# Altium footprint library LUMI_Standard_Auto_Soldering_LIB.PcbLib: 344 footprints (part 1 of 22)
Each footprint in its own frame and in the unit in brackets; x right, y up, seen from the top. Pads: shape width x height; smd on the part's side, far side on the other; paste and mask are expansions set on the pad; w line width, h text height; cw(c..) or ccw(c..) is an arc to the next point about the centre after c.
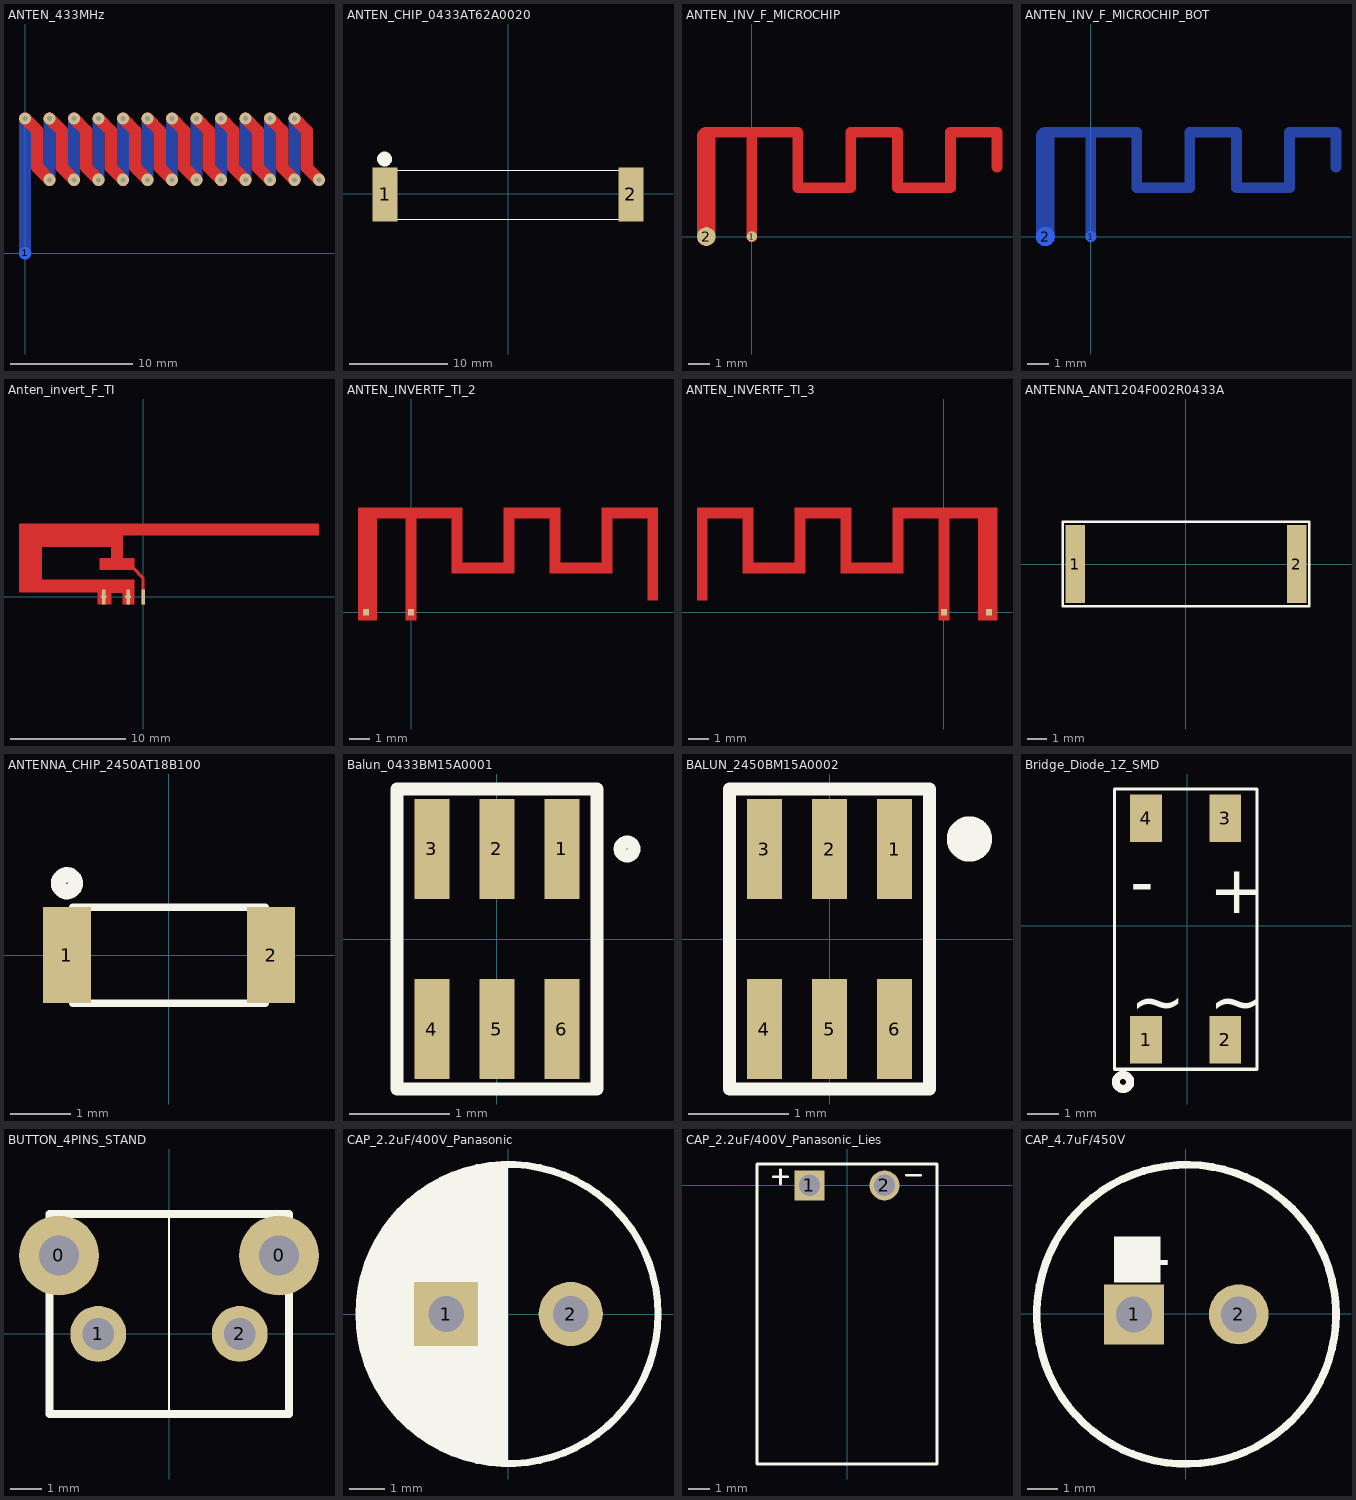
[diagram p0: the footprints below, top view; thin cyan lines are the x and y axes]

## ANTEN_433MHz [mm]
pads (1):
  round 1 smd far side mask+0: 1(0,0)
via 2,6 diameter 1 hole 0.4
via 4,6 diameter 1 hole 0.4
via 6,6 diameter 1 hole 0.4
via 8,6 diameter 1 hole 0.4
via 10,6 diameter 1 hole 0.4
via 12,6 diameter 1 hole 0.4
via 14,6 diameter 1 hole 0.4
via 16,6 diameter 1 hole 0.4
via 18,6 diameter 1 hole 0.4
via 20,6 diameter 1 hole 0.4
via 22,6 diameter 1 hole 0.4
via 24,6 diameter 1 hole 0.4
via 22,11 diameter 1 hole 0.4
via 20,11 diameter 1 hole 0.4
via 18,11 diameter 1 hole 0.4
via 16,11 diameter 1 hole 0.4
via 14,11 diameter 1 hole 0.4
via 12,11 diameter 1 hole 0.4
via 10,11 diameter 1 hole 0.4
via 8,11 diameter 1 hole 0.4
via 6,11 diameter 1 hole 0.4
via 4,11 diameter 1 hole 0.4
via 2,11 diameter 1 hole 0.4
via 0,11 diameter 1 hole 0.4
Top Layer:
  lines w1: 0,11 1,10 1,7 2,6 ; 2,11 3,10 3,7 4,6 ; 4,11 5,10 5,7 6,6 ; 6,11 7,10 7,7 8,6 ; 8,11 9,10 9,7 10,6 ; 10,11 11,10 11,7 12,6 ; 12,11 13,10 13,7 14,6 ; 14,11 15,10 15,7 16,6 ; 16,11 17,10 17,7 18,6 ; 18,11 19,10 19,7 20,6 ; 20,11 21,10 21,7 22,6 ; 22,11 23,10 23,7 24,6
Bottom Layer:
  lines w1: 0,0 0,11 ; 2,6 2,11 ; 4,6 4,11 ; 6,6 6,11 ; 8,6 8,11 ; 10,6 10,11 ; 12,6 12,11 ; 14,6 14,11 ; 16,6 16,11 ; 18,6 18,11 ; 20,6 20,11 ; 22,6 22,11

## ANTEN_CHIP_0433AT62A0020 [mm]
pads (2):
  rect 2.5x5.5 smd mask+0: 1(-12.522,-0.044) 2(12.5,-0.044)
Top Overlay:
  circle w1: c-12.573,3.556 r0.254
  lines w0.127: -12.5,-2.587 12.5,-2.587 12.5,2.413 -12.5,2.413 -12.5,-2.587
3D body: height 1.2, standoff 0, extent -12.522,-2.54 12.5,2.451
3D body: height 1.3, standoff 0, extent -12.7,-2.667 -11.684,2.54
3D body: height 1.3, standoff 0, extent 11.684,-2.73 12.7,2.476

## ANTEN_INV_F_MICROCHIP [mil]
pads (2):
  round 19.68 smd: 1(0,0)
  round 35 smd: 2(-85,0)
Top Layer:
  lines w20: -85,195 86,195 86,91 184.5,91 184.5,195 ; 0,0 0,193 ; 185,195 272,195 272,91 370.5,91 ; 371,91 371,195 458,195 458,130
  lines w35: -85,0 -85,187.5

## ANTEN_INV_F_MICROCHIP_BOT [mil]
pads (2):
  round 19.68 smd far side: 1(0,0)
  round 35 smd far side: 2(-85,0)
Bottom Layer:
  lines w20: -85,195 86,195 86,91 184.5,91 184.5,195 ; 0,0 0,193 ; 185,195 272,195 272,91 370.5,91 ; 371,91 371,195 458,195 458,130
  lines w35: -85,0 -85,187.5

## Anten_invert_F_TI [mm]
pads (6):
  rect 0.2x0.5 smd: 1(0,0)
  rect 0.3x1.3 smd paste-0.3 mask-0.3: 1(0,0) 2(-1.295,0) 3(-3.404,0)
  rect 0.5x0.2 smd: 2(-3.404,0) 2(-1.295,0)
Top Layer:
  region: -0.76,-0.66 -1.76,-0.66 -1.76,0.34 -2.76,0.34 -2.76,-0.66 -3.91,-0.66 -3.91,0.406 -10.742,0.406 -10.742,6.34 15.24,6.34 15.24,5.34 -1.76,5.34 -1.76,3.34 -0.76,3.34 -0.76,2.34 -3.76,2.34 -3.76,3.34 -2.76,3.34 -2.76,4.34 -8.76,4.34 -8.76,1.473 -0.76,1.473
  region: 0.127,-0.66 -0.127,-0.66 -0.127,1.563 0.127,1.563
  region: -0.127,1.549 -0.152,1.626 -0.991,2.464 -0.762,2.591 0.127,1.702 0.127,1.549

## ANTEN_INVERTF_TI_2 [mm]
pads (2):
  rect 0.3x0.3 smd paste+0 mask+0.102: 1(0,0) 2(-2.159,0)
Top Layer:
  region: -0.247,-0.375 -0.247,5.015 0.253,5.015 0.253,-0.375
  region: 6.653,1.875 6.653,2.375 9.653,2.375 9.653,1.875
  region: -2.547,4.515 -2.547,5.015 2.453,5.015 2.453,4.515
  region: -2.547,-0.375 -2.547,5.015 -1.647,5.015 -1.647,-0.375
  region: 1.953,5.015 1.953,1.875 2.453,1.875 2.453,5.015
  region: 1.953,1.875 1.953,2.375 4.953,2.375 4.953,1.875
  region: 4.453,4.515 4.453,5.015 7.153,5.015 7.153,4.515
  region: 9.153,4.515 9.153,5.015 11.853,5.015 11.853,4.515
  region: 4.953,5.015 4.953,1.875 4.453,1.875 4.453,5.015
  region: 7.153,1.875 7.153,5.015 6.653,5.015 6.653,1.875
  region: 9.653,5.015 9.653,1.875 9.153,1.875 9.153,5.015
  region: 11.853,0.575 11.853,5.015 11.353,5.015 11.353,0.575

## ANTEN_INVERTF_TI_3 [mm]
pads (2):
  rect 0.3x0.3 smd paste+0 mask+0.102: 1(0,0) 2(2.159,0)
Top Layer:
  region: -11.853,0.575 -11.853,5.015 -11.353,5.015 -11.353,0.575
  region: -9.653,5.015 -9.653,1.875 -9.153,1.875 -9.153,5.015
  region: -7.153,1.875 -7.153,5.015 -6.653,5.015 -6.653,1.875
  region: -4.953,5.015 -4.953,1.875 -4.453,1.875 -4.453,5.015
  region: -9.153,4.515 -9.153,5.015 -11.853,5.015 -11.853,4.515
  region: -4.453,4.515 -4.453,5.015 -7.153,5.015 -7.153,4.515
  region: -1.953,1.875 -1.953,2.375 -4.953,2.375 -4.953,1.875
  region: -1.953,5.015 -1.953,1.875 -2.453,1.875 -2.453,5.015
  region: 2.547,-0.375 2.547,5.015 1.647,5.015 1.647,-0.375
  region: 0.247,-0.375 0.247,5.015 -0.253,5.015 -0.253,-0.375
  region: 2.547,4.515 2.547,5.015 -2.453,5.015 -2.453,4.515
  region: -6.653,1.875 -6.653,2.375 -9.653,2.375 -9.653,1.875

## ANTENNA_ANT1204F002R0433A [mm]
pads (2):
  rect 1x4 smd: 1(-5.651,0) 2(5.652,0)
Top Overlay:
  lines w0.127: -6.286,-2.159 -6.286,2.159 6.287,2.159 6.287,-2.159 -6.286,-2.159
3D body: height 1.6, standoff 0, extent 6.033,-2.032 6.16,2.032
3D body: height 1.6, standoff 0, extent -6.159,-2.032 -6.032,2.032
3D body: height 1.6, standoff 0, extent -6.032,-2.032 6.033,2.032

## ANTENNA_CHIP_2450AT18B100 [mm]
pads (2):
  rect 0.8x1.6 smd mask+0: 1(-1.7,0) 2(1.7,0)
Top Overlay:
  circle w0.254: c-1.7,1.2 r0.141
  lines w0.127: -1.6,-0.8 1.6,-0.8 1.6,0.8 -1.6,0.8 -1.6,-0.8
3D body: height 1.3, standoff 0, extent -1.6,-0.8 1.6,0.8

## Balun_0433BM15A0001 [mm]
pads (6):
  rect 0.35x1 smd mask+0.07: 1(0.65,0.9) 2(0,0.9) 3(-0.65,0.9) 4(-0.65,-0.9) 5(0,-0.9) 6(0.65,-0.9)
Top Overlay:
  circle w0.127: c1.3,0.9 r0.071
  lines w0.127: -1,-1.5 -1,1.5 1,1.5 1,-1.5 -1,-1.5
3D body: height 0.7, standoff 0, extent -1,-0.625 1,0.625

## BALUN_2450BM15A0002 [mm]
pads (6):
  rect 0.35x1 smd mask+0: 1(0.65,0.9) 3(-0.65,0.9) 4(-0.65,-0.9) 5(0,-0.9) 6(0.65,-0.9)
  rect 0.35x1 smd paste+0 mask+0: 2(0,0.9)
Top Overlay:
  circle w0.254: c1.4,1 r0.1
  lines w0.127: -1,-1.5 1,-1.5 1,1.5 -1,1.5 -1,-1.5
3D body: height 0.7, standoff 0, extent -1,-0.6 1,0.6

## Bridge_Diode_1Z_SMD [mm] "Footprint for bridge diode S1ZB60-7102"
pads (4):
  rect 1x1.5 smd: 1(-1.3,-3.6) 2(1.2,-3.6) 3(1.2,3.4) 4(-1.3,3.4)
Top Overlay:
  circle w0.254: c-2.025,-4.925 r0.224
  lines w0.1: -2.3,-4.525 -2.3,4.325 2.2,4.325 2.2,-4.525 -2.3,-4.525
  text "-" at -1.8,0.65 h1.52
  text "+" at 0.7,0.4 h1.52
  text "~" at -1.8,-3.1 h1.52
  text "~" at 0.7,-3.1 h1.52
3D body: height 1.5, standoff 0.2, extent -2.3,-2.1 2.2,1.9

## BUTTON_4PINS_STAND [mm]
pads (4):
  round 2.54 hole 1.27: 0(-3.5,2.5) 0(3.5,2.5)
  round 1.778 hole 1.016: 1(-2.25,0) 2(2.25,0)
Top Overlay:
  lines w0.076: 0,-2.5 0,3.75
  lines w0.254: -3.806,-2.54 3.814,-2.54 3.814,3.81 -3.806,3.81 -3.806,-2.54
3D body: height 7.4, standoff -3.5, extent -4.35,-3.15 4.35,4

## CAP_2.2uF/400V_Panasonic [mm]
pads (2):
  rect 1.8x1.8 hole 1: 1(-1.75,0)
  round 1.8 hole 1: 2(1.75,0)
Top Overlay:
  circle w0.2: c0,0 r4.2
  pour cut-out: -2.529,0.95 -1.005,0.95 -1.005,2.474 -2.529,2.474
  region: -0.025,-4.154 -0.075,-4.175 -0.65,-4.175 -0.675,-4.15 -0.775,-4.05 -1.3,-4.05 -1.4,-3.95 -1.525,-3.825 -1.825,-3.825 -1.925,-3.725 -2.075,-3.575 -2.275,-3.575 -2.425,-3.425 -2.575,-3.275 -2.65,-3.275 -2.75,-3.175 -2.875,-3.05 -2.875,-3.025 -3,-2.9 -3.1,-2.8 -3.15,-2.8 -3.15,-2.75 -3.225,-2.675 -3.375,-2.525 -3.375,-2.5 -3.375,-2.475 -3.475,-2.375 -3.575,-2.275 -3.575,-2.15 -3.575,-2.05 -3.725,-1.9 -3.8,-1.825 -3.8,-1.75 -3.8,-1.7 -3.925,-1.575 -3.975,-1.525 -3.975,-1.375 -3.975,-1.15 -4.075,-1.05 -4.125,-1 -4.125,-0.8 -4.125,-0.675 -4.175,-0.625 -4.225,-0.575 -4.225,-0.275 -4.225,-0.025 -4.2,0 -4.175,0.025 -4.175,0.25 -4.175,0.575 -4.15,0.6 -4.15,0.85 -4.15,1.025 -4.05,1.125 -3.95,1.225 -3.95,1.35 -3.95,1.45 -3.85,1.55 -3.85,1.725 -3.85,1.775 -3.725,1.9 -3.7,1.925 -3.7,2.075 -3.7,2.1 -3.55,2.25 -3.45,2.35 -3.45,2.4 -3.45,2.45 -3.325,2.575 -3.2,2.7 -3.2,2.75 -3.05,2.9 -2.85,3.1 -2.825,3.1 -2.775,3.15 -2.575,3.35 -2.475,3.35 -2.375,3.45 -2.225,3.6 -2.025,3.6 -1.85,3.775 -1.75,3.875 -1.45,3.875 -1.375,3.95 -1.3,4.025 -0.95,4.025 -0.85,4.125 -0.8,4.175 -0.275,4.175 -0.25,4.2 -0.025,4.2 hole: -1.005,2.474 -2.529,2.474 -2.529,0.95 -1.005,0.95
  text "+" at -2.275,0.95 h1.52
3D body: height 12.13, standoff -2.37, extent -3.996,-4 4.004,4

## CAP_2.2uF/400V_Panasonic_Lies [mm]
pads (2):
  rect 1.4x1.4 hole 1: 1(-1.75,0)
  round 1.4 hole 1: 2(1.75,0)
Top Overlay:
  lines w0.127: -3.437,0.4 -2.762,0.4 ; -3.1,0.062 -3.1,0.737 ; 2.762,0.475 3.437,0.475
  lines w0.15: -4.2,-13 4.2,-13 4.2,1 -4.2,1 -4.2,-13
3D body: height 8, standoff 0, extent -4,-13.027 4,1.473

## CAP_4.7uF/450V [mm]
pads (2):
  rect 2x2 hole 1.2: 1(-1.725,-0.023)
  round 2 hole 1.2: 2(1.775,-0.023)
Top Overlay:
  circle w0.254: c0.025,-0.023 r5
  pour cut-out: -2.377,1.054 -0.853,1.054 -0.853,2.578 -2.377,2.578
  lines w0.127: 0,-5 cw(c0,0) 0,5
  text "+" at -2.123,1.054 h1.52
3D body: height 12.6, standoff 0.1, extent -4.961,-4.99 5,4.99
3D body: height 1, standoff -2, extent 1.279,-0.522 2.275,0.476
3D body: height 1, standoff -2, extent -2.221,-0.522 -1.225,0.476